# Altium integrated library Integrated_Library - 02.02.25 - 22.49.IntLib: 792 symbols (part 3 of 11)
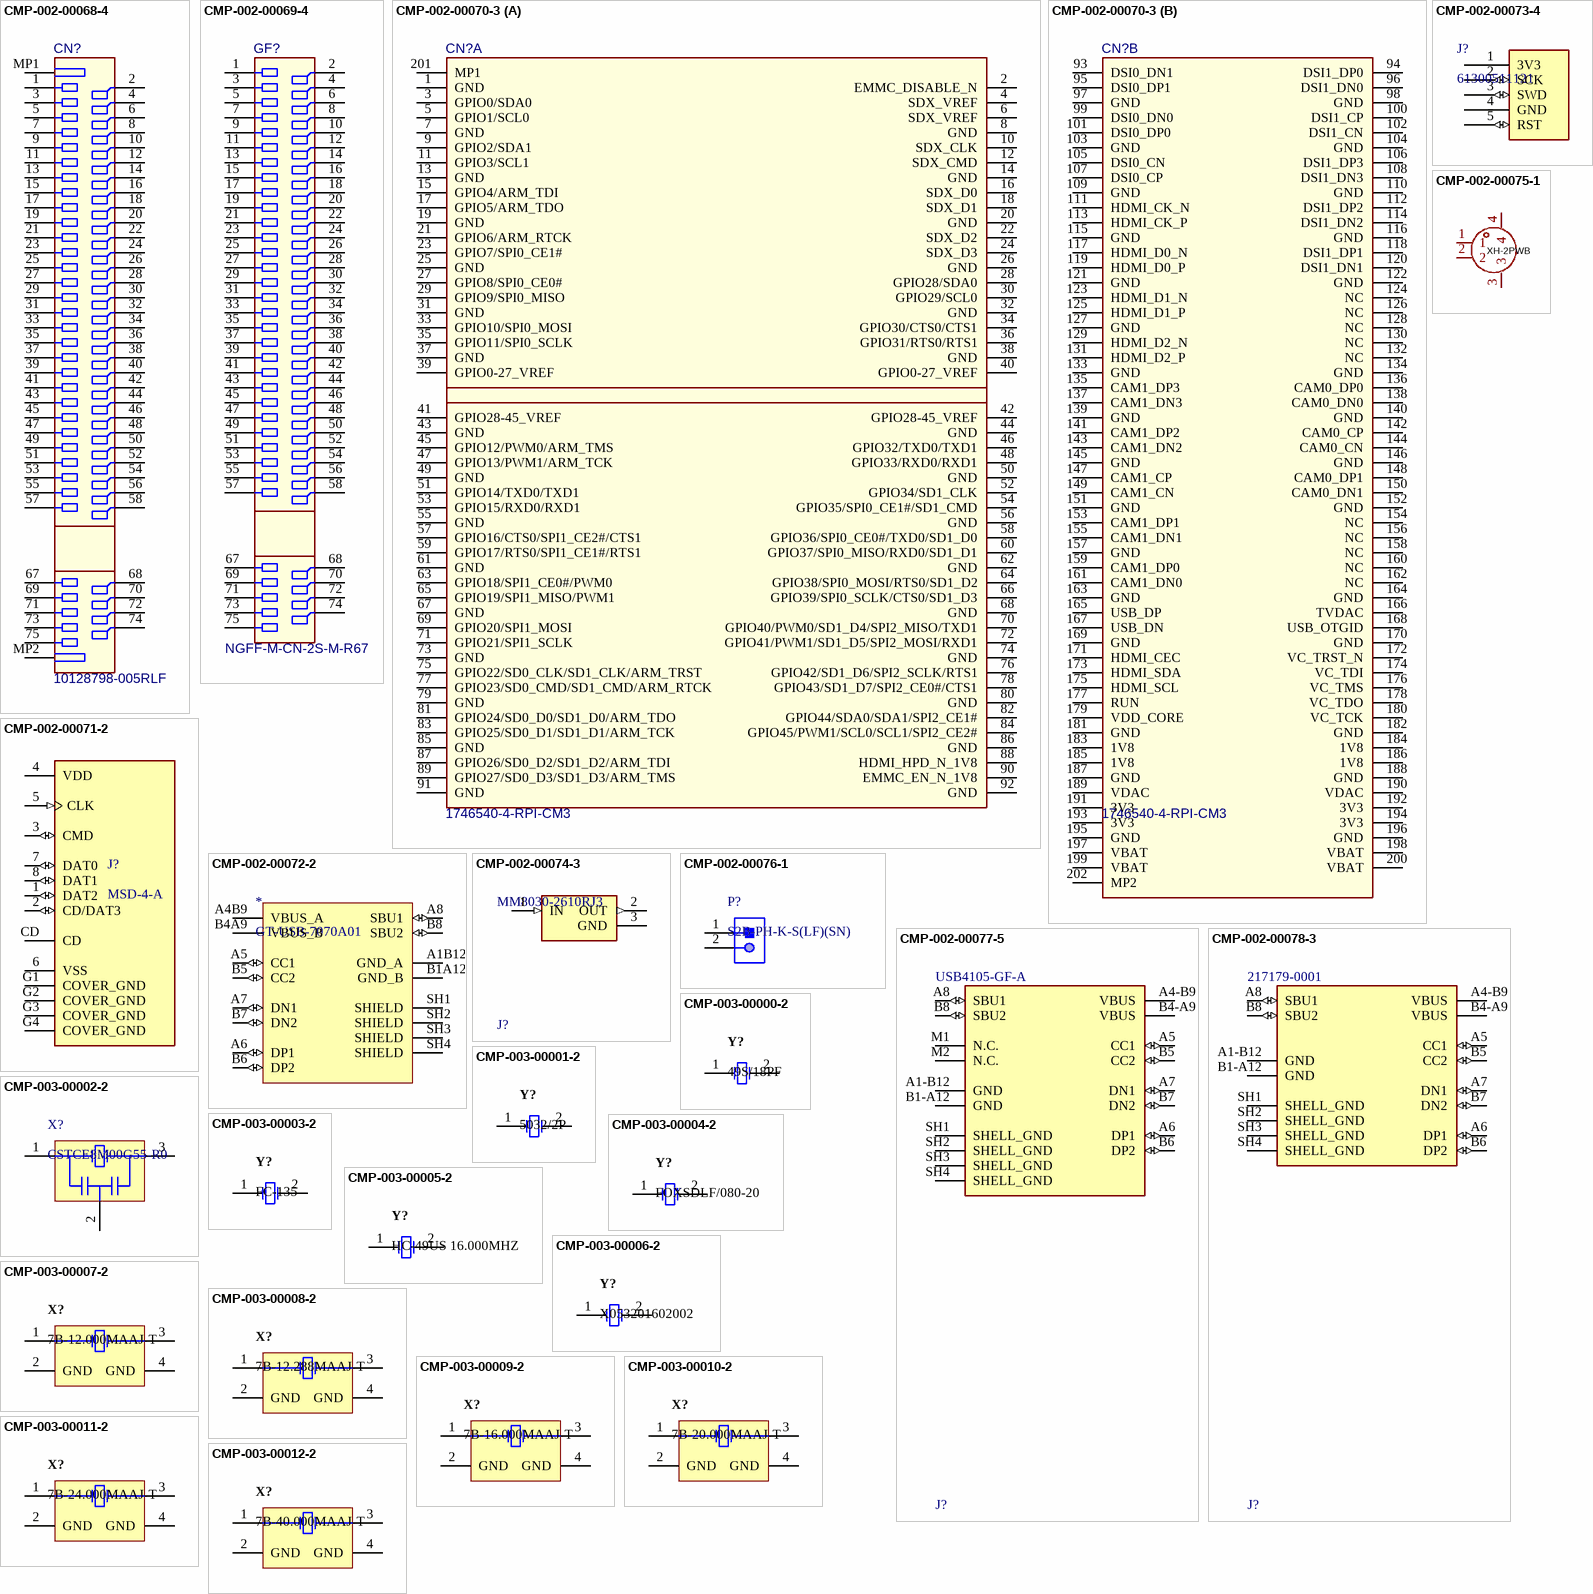
[diagram p28: symbols CMP-002-00068-4 to CMP-003-00012-2]

## CMP-002-00070-3
designator CN?, comment 1746540-4-RPI-CM3
Raspberry Pi Compute Module 3 socket; Pins: 202
footprint TECO-1746540-4_V (SMD, 200-Leads, Body 71.5x26.55mm, Pitch 0.6mm)
footprint TECO-1746540-4_V (SMD, 200-Leads, Body 71.5x26.55mm, Pitch 0.6mm)
part A pins: 1 GND, 2 EMMC_DISABLE_N, 3 GPIO0/SDA0, 4 SDX_VREF, 5 GPIO1/SCL0, 6 SDX_VREF, 7 GND, 8 GND, 9 GPIO2/SDA1, 10 SDX_CLK, 11 GPIO3/SCL1, 12 SDX_CMD, 13 GND, 14 GND, 15 GPIO4/ARM_TDI, 16 SDX_D0, 17 GPIO5/ARM_TDO, 18 SDX_D1, 19 GND, 20 GND, 21 GPIO6/ARM_RTCK, 22 SDX_D2, 23 GPIO7/SPI0_CE1#, 24 SDX_D3, 25 GND, 26 GND, 27 GPIO8/SPI0_CE0#, 28 GPIO28/SDA0, 29 GPIO9/SPI0_MISO, 30 GPIO29/SCL0, 31 GND, 32 GND, 33 GPIO10/SPI0_MOSI, 34 GPIO30/CTS0/CTS1, 35 GPIO11/SPI0_SCLK, 36 GPIO31/RTS0/RTS1, 37 GND, 38 GND, 39 GPIO0-27_VREF, 40 GPIO0-27_VREF, 41 GPIO28-45_VREF, 42 GPIO28-45_VREF, 43 GND, 44 GND, 45 GPIO12/PWM0/ARM_TMS, 46 GPIO32/TXD0/TXD1, 47 GPIO13/PWM1/ARM_TCK, 48 GPIO33/RXD0/RXD1, 49 GND, 50 GND, 51 GPIO14/TXD0/TXD1, 52 GPIO34/SD1_CLK, 53 GPIO15/RXD0/RXD1, 54 GPIO35/SPI0_CE1#/SD1_CMD, 55 GND, 56 GND, 57 GPIO16/CTS0/SPI1_CE2#/CTS1, 58 GPIO36/SPI0_CE0#/TXD0/SD1_D0, 59 GPIO17/RTS0/SPI1_CE1#/RTS1, 60 GPIO37/SPI0_MISO/RXD0/SD1_D1, 61 GND, 62 GND, 63 GPIO18/SPI1_CE0#/PWM0, 64 GPIO38/SPI0_MOSI/RTS0/SD1_D2, 65 GPIO19/SPI1_MISO/PWM1, 66 GPIO39/SPI0_SCLK/CTS0/SD1_D3, 67 GND, 68 GND, 69 GPIO20/SPI1_MOSI, 70 GPIO40/PWM0/SD1_D4/SPI2_MISO/TXD1, 71 GPIO21/SPI1_SCLK, 72 GPIO41/PWM1/SD1_D5/SPI2_MOSI/RXD1, 73 GND, 74 GND, 75 GPIO22/SD0_CLK/SD1_CLK/ARM_TRST, 76 GPIO42/SD1_D6/SPI2_SCLK/RTS1, 77 GPIO23/SD0_CMD/SD1_CMD/ARM_RTCK, 78 GPIO43/SD1_D7/SPI2_CE0#/CTS1, 79 GND, 80 GND, 81 GPIO24/SD0_D0/SD1_D0/ARM_TDO, 82 GPIO44/SDA0/SDA1/SPI2_CE1#, 83 GPIO25/SD0_D1/SD1_D1/ARM_TCK, 84 GPIO45/PWM1/SCL0/SCL1/SPI2_CE2#, 85 GND, 86 GND, 87 GPIO26/SD0_D2/SD1_D2/ARM_TDI, 88 HDMI_HPD_N_1V8, 89 GPIO27/SD0_D3/SD1_D3/ARM_TMS, 90 EMMC_EN_N_1V8, 91 GND, 92 GND, 201 MP1
part B pins: 93 DSI0_DN1, 94 DSI1_DP0, 95 DSI0_DP1, 96 DSI1_DN0, 97 GND, 98 GND, 99 DSI0_DN0, 100 DSI1_CP, 101 DSI0_DP0, 102 DSI1_CN, 103 GND, 104 GND, 105 DSI0_CN, 106 DSI1_DP3, 107 DSI0_CP, 108 DSI1_DN3, 109 GND, 110 GND, 111 HDMI_CK_N, 112 DSI1_DP2, 113 HDMI_CK_P, 114 DSI1_DN2, 115 GND, 116 GND, 117 HDMI_D0_N, 118 DSI1_DP1, 119 HDMI_D0_P, 120 DSI1_DN1, 121 GND, 122 GND, 123 HDMI_D1_N, 124 NC, 125 HDMI_D1_P, 126 NC, 127 GND, 128 NC, 129 HDMI_D2_N, 130 NC, 131 HDMI_D2_P, 132 NC, 133 GND, 134 GND, 135 CAM1_DP3, 136 CAM0_DP0, 137 CAM1_DN3, 138 CAM0_DN0, 139 GND, 140 GND, 141 CAM1_DP2, 142 CAM0_CP, 143 CAM1_DN2, 144 CAM0_CN, 145 GND, 146 GND, 147 CAM1_CP, 148 CAM0_DP1, 149 CAM1_CN, 150 CAM0_DN1, 151 GND, 152 GND, 153 CAM1_DP1, 154 NC, 155 CAM1_DN1, 156 NC, 157 GND, 158 NC, 159 CAM1_DP0, 160 NC, 161 CAM1_DN0, 162 NC, 163 GND, 164 GND, 165 USB_DP, 166 TVDAC, 167 USB_DN, 168 USB_OTGID, 169 GND, 170 GND, 171 HDMI_CEC, 172 VC_TRST_N, 173 HDMI_SDA, 174 VC_TDI, 175 HDMI_SCL, 176 VC_TMS, 177 RUN, 178 VC_TDO, 179 VDD_CORE, 180 VC_TCK, 181 GND, 182 GND, 183 1V8 (power), 184 1V8, 185 1V8, 186 1V8, 187 GND, 188 GND, 189 VDAC, 190 VDAC, 191 3V3, 192 3V3, 193 3V3, 194 3V3, 195 GND, 196 GND, 197 VBAT, 198 VBAT, 199 VBAT, 200 VBAT, 202 MP2

## CMP-002-00071-2
designator J?, comment MSD-4-A
Micro SD Card Connector, 9 Positions, Connector and Ejector, Push In, Auto Eject Out, Surface Mount, 1.8 mm Height Above Board, Gold Flash; MF: CUI Devices; Check_prices: https://www.snapeda.com/parts/MSD-4-A/CUI+Devices/view-part/?ref=eda; SnapEDA_Link: https://www.snapeda.com/parts/MSD-4-A/CUI+Devices/view-part/?ref=snap; CUI_purchase_URL: https://www.cuidevices.com/product/interconnect/connectors/memory-card-connectors/sd-card-connectors/msd-4-a?utm_source=snapeda.com&utm_medium=referral&utm_campaign=snapedaBOM; MP: MSD-4-A; Case/Package: None; Source: MSD-4-A.SchLib; Value: *; Component Type: Standard; Pins: 13; Design Item ID: MSD-4-A
footprint CUI_MSD-4-A
footprint CUI_MSD-4-A
pins: 1 DAT2 (io), 2 CD/DAT3 (io), 3 CMD (io), 4 VDD (power), 5 CLK (in), 6 VSS (power), 7 DAT0 (io), 8 DAT1 (io), CD, G1 COVER_GND (power), G2 COVER_GND (power), G3 COVER_GND (power), G4 COVER_GND (power)

## CMP-002-00072-2
designator *, comment GT-USB-7070A01
USB 2.0 5A 1 260℃ Horizontal attachment 16P Female -40℃~+85℃ Gold High conductivity copper Type-C SMD USB Connectors...; Connector Type: USB 2.0 Type C; Voltage Rating: 24V; Min Operating Temperature: -40°C; Max Operating Temperature: 85°C; RoHS Compliant: Yes; Gender: Female; Mounting Technology: SMD; Pins: 16; Case/Package: SMD; Max Current Rating: 5A
footprint GT-USB-7070A01-Footprint-1
pins: A1B12 GND_A (power), A4B9 VBUS_A (power), A5 CC1 (io), A6 DP1 (io), A7 DN1 (io), A8 SBU1 (io), B1A12 GND_B (power), B4A9 VBUS_B (power), B5 CC2 (io), B6 DP2 (io), B7 DN2 (io), B8 SBU2 (io), SH1 SHIELD, SH2 SHIELD, SH3 SHIELD, SH4 SHIELD

## CMP-002-00073-4
designator J?, comment 61300511121
Board Connector, 5 Contact(s), 1 Row(s), Male, Straight, 0.1 inch Pitch, Solder Terminal, Locking, Black Insulator, Plug; Body Length: 0.5inch; Body/Shell Style: PLUG; Body Breadth: 0.1inch; Min Operating Temperature: -40°C; RoHS Compliant: Yes; Max Operating Temperature: 125°C; Mounting Technology: Board; Body Depth: 0.1inch; Connector Type: BOARD CONNECTOR
footprint New footprint 1-33
footprint 61300511121 (Pin Header, pitch 2.54 mm, THT, Vertical, single row, 5p)
pins: 1 3V3 (power), 2 SCK (io), 3 SWD (io), 4 GND (power), 5 RST (io)

## CMP-002-00074-3
designator J?, comment MM8030-2610RJ3
RF Connector, Female, Board Mount, Surface Mount Terminal; Insertion Loss: 0.5dB; VSWR: 1.5; IEC Conformance: No; Panel Mount: No; Option: General Purpose; Characteristic Impedance: 50R; Operating Frequency-Max: 11GHz; Coupling Type: Snap; Reach SVHC Compliant: No; Mounting Technology: Board; Termination: SMD/SMT; Connector Type: RF CONNECTOR; MIL Conformance: No; Contact Gender: Female; Filter Feature: No; Mounting Style: STRAIGHT; DIN Conformance: No
footprint FP-MM8030-2610RJ3-MFG
pins: 1 IN (in), 2 OUT (out), 3 GND (power)

## CMP-002-00075-1
designator FPC?, comment XH-2PWB
JST Connector XH-2PWB; Manufacturer: DEALON(德艺隆); Symbol: XH-2PWB_C2905024; Add into BOM: yes; Pins Structure: 1x2P; Pitch: 2.5mm; Reference Series: XH; Number of PINs Per Row: 2; Current Rating (Max): 3A; Device: XH-2PWB; LCSC Part Name: 1x2P 间距:2.5mm 卧贴 系列:XH; Supplier Part: C2905024; Manufacturer Part: XH-2PWB; Supplier Footprint: SMD,P=2.5mm,卧贴; JLCPCB Part Class: Extended Part; Datasheet: https://atta.szlcsc.com/upload/public/pdf/source/20211025/6C2B75DB1AEBD099C7E95723735B67A6.pdf; Supplier: LCSC; Convert to PCB: yes; Mounting Style: 卧贴; Number of Pins: 2P; Number of Rows: 1; Row Spacing: -; Operating Temperature Range: -25℃~+85℃
footprint CONN-SMD_2P-P2.50_DEALON_XH-2PWB_C2905024
footprint New footprint 1-33
pins: 1, 2, 3, 4

## CMP-002-00076-1
designator P?, comment S2B-PH-K-S(LF)(SN)
Header for PCB; pitch 2.00mm; 2-contacts; THT; male; side entry; 100V/2A
footprint JST-S2B-PH-K-S_V-22 (THD, 2-Leads, Body 7.6x5.9mm, Pitch 2mm)
pins: 1, 2

## CMP-002-00077-5
designator J?, comment USB4105-GF-A
Conn USB 2.0 Type C RCP 24 POS 0.3mm/0.5mm Solder RA SMD 24 Terminal 1 Port T/R
footprint FP-USB4105-GF-A-MFG
pins: A1-B12 GND (power), A4-B9 VBUS (power), A5 CC1 (io), A6 DP1 (io), A7 DN1 (io), A8 SBU1 (io), B1-A12 GND (power), B4-A9 VBUS (power), B5 CC2 (io), B6 DP2 (io), B7 DN2 (io), B8 SBU2 (io), M1 N.C., M2 N.C., SH1 SHELL_GND (power), SH2 SHELL_GND (power), SH3 SHELL_GND (power), SH4 SHELL_GND (power)

## CMP-002-00078-3
designator J?, comment 217179-0001
USB Connector, 16 Contact(s), Female, Right Angle, Surface Mount Terminal, Locking, Receptacle
footprint FP-2171790001-MFG
pins: A1-B12 GND (power), A4-B9 VBUS (power), A5 CC1 (io), A6 DP1 (io), A7 DN1 (io), A8 SBU1 (io), B1-A12 GND (power), B4-A9 VBUS (power), B5 CC2 (io), B6 DP2 (io), B7 DN2 (io), B8 SBU2 (io), SH1 SHELL_GND (power), SH2 SHELL_GND (power), SH3 SHELL_GND (power), SH4 SHELL_GND (power)

## CMP-003-00000-2
designator Y?, comment 49S/18PF
Crystal, 16 MHz, +/-20 ppm, 18 pF, -20 to 70 degC, 2-Pin THD, RoHS; Manufacturer: Shenzhen Jingpengyuan; Frequency: 16MHz; Package Description: 2-Pin Through Hole Device, Body 11.05 x 4.65 mm, Pitch 4.88 mm; Mounting Technology: TH; Datasheet Version: Aug-14; Package Reference: 49S-18PF; RoHS Compliant: Unknown; Datasheet URL: http://datasheet.octopart.com/49S-18PF-Xinhunjing-datasheet-30677139.pdf; Case/Package: 49S-18PF; Manufacturer URL: http://www.chjiahui.com/
footprint JPY-49S-18PF (THD, 2-Leads, Body 11.05x4.65mm, Pitch 4.88mm)
pins: 1, 2

## CMP-003-00001-2
designator Y?, comment 5032/2P
SMD Quartz Crystal, 10 to 50 MHz, +/-30 ppm, 8 to 32 pF, 2-Pin SMD, RoHS, Tape and Reel; Manufacturer: NEWXTAL; RoHS Compliant: Unknown; Package Description: 2-Pin Surface Mount Device, Body 5 x 3.2 mm; Mounting Technology: SM; Manufacturer URL: http://www.newxtal.com/; Datasheet Version: Aug-09; Case/Package: 5032-2P; Package Reference: 5032-2P; Datasheet URL: http://www.newxtal.com/FILES/data/200984214656762.pdf
footprint NEWX-5032-2P_V (SMD, 2-Leads, Body 5x3.2mm)
pins: 1, 2

## CMP-003-00002-2
designator X?, comment CSTCE8M00G55-R0
Ceramic Resonator, 8 MHz, +/- 0.5%, 30/33/39 pF, -20 to 80 degC, 3-Pin SMD, RoHS, Tape and Reel; Manufacturer: Murata; Impedance: 40Ohm; Frequency: 8MHz; Load Capacitance: 33pF; Packaging: TapeandReel; Datasheet URL: http://www.murata.com/~/media/webrenewal/support/library/catalog/products/timingdevice/ceralock/p16e.ashx; Package Reference: CSTCE_G_A-3; Min Operating Temperature: -20°C; Manufacturer URL: http://www.murata.com/; Pins: 3; Tolerance: 0.5%; Self Resonant Frequency: 8MHz; Package Description: 3-Pin Surface Mount Device, Body 3.2 x 1.3 mm, Pitch 1.2 mm; Mounting Technology: SM; RoHS Compliant: True; Datasheet Version: Dec-15; Package Quantity: 1; Case/Package: CSMD; Max Operating Temperature: 80°C; Frequency Tolerance: 0.5%
footprint MURA-CSTCE_G_A-3_V (SMD, 3-Leads, Body 3.2x1.3mm, Pitch 1.2mm)
pins: 1 X1, 2 GND (power), 3 X2

## CMP-003-00003-2
designator Y?, comment FC-135
Crystal Unit, 32 to 77.5 KHz, 0.5 to 1.3 pF, -40 to 85 degC, 2-Pin SMD, RoHS; Manufacturer: Epson; Manufacturer URL: https://www.eea.epson.com/; Datasheet URL: http://www5.epsondevice.com/en/products/khz_range/fc135r.html#; Mounting Technology: SM; Package Description: 2-Pin Surface Mount Device, Body 3.2 x 1.5 mm; Datasheet Version: Feb-15; Package Reference: FC-135; RoHS Compliant: False; Case/Package: FC-135
footprint EPSON-FC-135_V (SMD, 2-Leads, Body 3.2x1.5mm)
pins: 1, 2

## CMP-003-00004-2
designator Y?, comment FOXSDLF/080-20
Resistance Weld Crystal, 8 MHz, +/- 30 ppm, 20 pF, -20 to 70 degC, 2-Pin SMD, RoHS, Tape and Reel; Manufacturer: FOX Electronics; Resistance: 80Ohm; Load Capacitance: 20pF; ESR: 80; Frequency: 8MHz; Frequency Tolerance: 30ppm; Tolerance: 50ppm; Max Operating Temperature: 70°C; Pins: 2; Case/Package: HC49SDLF; Min Operating Temperature: -20°C; Mounting Technology: SM; Packaging: CutTape; Package Description: 2-Pin Surface Mount Device, Body 5 x 11.7 mm; RoHS Compliant: True; Package Reference: HC49SDLF; Package Quantity: 1; Manufacturer URL: http://www.foxonline.com/; Datasheet Version: Mar-15; Datasheet URL: http://www.foxonline.com/pdfs/hc49sdlf.pdf
footprint FOX-HC49SDLF_V (SMD, 2-Leads, Body 5x11.7mm)
pins: 1, 2

## CMP-003-00005-2
designator Y?, comment HC-49US 16.000MHZ
Crystal, 16 MHz, +/- 30 ppm, 18 pF, -20 to 70 degC, 2-Pin THD; Manufacturer: Jing peng yuan; Frequency: 16MHz; Package Reference: HC-49US; Case/Package: HC-49US; RoHS Compliant: Unknown; Mounting Technology: TH; Package Description: 2-Pin Throug Hole Device, Body 11.05 x 4.65 mm, Pitch 4.9 mm; Datasheet URL: https://statics3.seeedstudio.com/images/opl/datasheet/306010014.pdf; Datasheet Version: May-15
footprint JPY-HC-49US (THD, 2-Leads, Body 11.05x4.65mm, Pitch 4.9mm)
pins: 1, 2

## CMP-003-00006-2
designator Y?, comment X053201602002
SMD Crystal, 16 MHz, +/- 20 ppm, 8 pF, -20 to 70 degC, 2-Pin SMD; Manufacturer: Shenzhen Jingpengyuan; Frequency: 16MHz; Datasheet URL: http://datasheet.octopart.com/X053201602002-Jingpengyuan-datasheet-62330935.pdf; RoHS Compliant: Unknown; Case/Package: X053201602002; Manufacturer URL: http://www.chjiahui.com/; Datasheet Version: May-13; Package Reference: X053201602002; Package Description: 2-Pin Surface Mount Device, Body 5 x 3.2 mm; Mounting Technology: SM
footprint JPY-X053201602002_V (SMD, 2-Leads, Body 5x3.2mm)
pins: 1, 2

## CMP-003-00007-2
designator X?, comment 7B-12.000MAAJ-T
SMD Seam Sealing Crystal, 12 MHz, +/- 30 ppm, 18 pF, -10 to 70 degC, 4-Pin SMD, RoHS, Tape and Reel; Manufacturer: TXC; Frequency: 12MHz; Tolerance: 30ppm; Resistance: 100Ohm; ESR: 40; Load Capacitance: 18pF; Package Quantity: 1; Pins: 4; Datasheet URL: http://www.txccorp.com/download/products/quartz_crystals/2015TXC_7B_19.pdf; Case/Package: 7B-4; Max Operating Temperature: 70°C; Packaging: TapeandReel; Package Description: 4-Pin Surface Mount Device, Body 5 x 3.2 mm, Pitch 3.7 mm; Frequency Tolerance: 30ppm; RoHS Compliant: True; Mounting Technology: SM; Package Reference: 7B-4; Min Operating Temperature: -20°C; Datasheet Version: Jul-15
footprint TXC-7B-4_V (SMD, 4-Leads, Body 5x3.2mm, Pitch 3.7mm)
pins: 1 X1, 2 GND (power), 3 X2, 4 GND (power)

## CMP-003-00008-2
designator X?, comment 7B-12.288MAAJ-T
SMD Seam Sealing Crystal, 12.288 MHz, +/- 30 ppm, 18 pF, -10 to 70 degC, 4-Pin SMD, RoHS, Tape and Reel; Manufacturer: TXC; Frequency Tolerance: 30ppm; ESR: 40; Load Capacitance: 18pF; Datasheet URL: http://www.txccorp.com/download/products/quartz_crystals/2015TXC_7B_19.pdf; Case/Package: 7B-4; Min Operating Temperature: -20°C; Package Reference: 7B-4; Datasheet Version: Jul-15; Tolerance: 30ppm; Packaging: TapeandReel; Mounting Technology: SM; Max Operating Temperature: 70°C; Package Quantity: 1000; RoHS Compliant: True; Pins: 4; Package Description: 4-Pin Surface Mount Device, Body 5 x 3.2 mm, Pitch 3.7 mm; Frequency: 12.288MHz
footprint TXC-7B-4_V (SMD, 4-Leads, Body 5x3.2mm, Pitch 3.7mm)
pins: 1 X1, 2 GND (power), 3 X2, 4 GND (power)

## CMP-003-00009-2
designator X?, comment 7B-16.000MAAJ-T
SMD Seam Sealing Crystal, 16 MHz, +/- 30 ppm, 18 pF, -10 to 70 degC, 4-Pin SMD, RoHS, Tape and Reel; Manufacturer: TXC; ESR: 40; Resistance: 40Ohm; Frequency: 16MHz; Tolerance: 30ppm; Load Capacitance: 18pF; Datasheet Version: Jul-15; Datasheet URL: http://www.txccorp.com/download/products/quartz_crystals/2015TXC_7B_19.pdf; Min Operating Temperature: -10°C; Case/Package: 7B-4; Package Description: 4-Pin Surface Mount Device, Body 5 x 3.2 mm, Pitch 3.7 mm; RoHS Compliant: True; Mounting Technology: SM; Max Operating Temperature: 70°C; Package Reference: 7B-4; Package Quantity: 1000; Packaging: TapeandReel; Pins: 4; Frequency Tolerance: 30ppm
footprint TXC-7B-4_V (SMD, 4-Leads, Body 5x3.2mm, Pitch 3.7mm)
pins: 1 X1, 2 GND (power), 3 X2, 4 GND (power)

## CMP-003-00010-2
designator X?, comment 7B-20.000MAAJ-T
SMD Seam Sealing Crystal, 20 MHz, +/- 30 ppm, 18 pF, -10 to 70 degC, 4-Pin SMD, RoHS, Tape and Reel; Manufacturer: TXC; Tolerance: 30ppm; Resistance: 40Ohm; Load Capacitance: 18pF; Frequency: 20MHz; ESR: 40; Package Reference: 7B-4; Mounting Technology: SM; RoHS Compliant: True; Package Quantity: 1000; Package Description: 4-Pin Surface Mount Device, Body 5 x 3.2 mm, Pitch 3.7 mm; Case/Package: 7B-4; Pins: 4; Datasheet Version: Jul-15; Datasheet URL: http://www.txccorp.com/download/products/quartz_crystals/2015TXC_7B_19.pdf; Packaging: TapeandReel; Frequency Tolerance: 30ppm; Min Operating Temperature: -20°C; Max Operating Temperature: 70°C
footprint TXC-7B-4_V (SMD, 4-Leads, Body 5x3.2mm, Pitch 3.7mm)
pins: 1 X1, 2 GND (power), 3 X2, 4 GND (power)

## CMP-003-00011-2
designator X?, comment 7B-24.000MAAJ-T
SMD Seam Sealing Crystal, 24 MHz, +/- 30 ppm, 18 pF, -10 to 70 degC, 4-Pin SMD, RoHS, Tape and Reel; Manufacturer: TXC; Resistance: 40Ohm; Frequency: 24MHz; Tolerance: 30ppm; ESR: 40; Load Capacitance: 18pF; Package Description: 4-Pin Surface Mount Device, Body 5 x 3.2 mm, Pitch 3.7 mm; Pins: 4; Mounting Technology: SM; Package Reference: 7B-4; Max Operating Temperature: 70°C; Package Quantity: 1000; Min Operating Temperature: -20°C; Datasheet URL: http://www.txccorp.com/download/products/quartz_crystals/2015TXC_7B_19.pdf; RoHS Compliant: True; Datasheet Version: Jul-15; Case/Package: 7B-4; Packaging: TapeandReel; Frequency Tolerance: 30ppm
footprint TXC-7B-4_V (SMD, 4-Leads, Body 5x3.2mm, Pitch 3.7mm)
pins: 1 X1, 2 GND (power), 3 X2, 4 GND (power)

## CMP-003-00012-2
designator X?, comment 7B-40.000MAAJ-T
9B Series Quartz Crystal, 40 MHz, +/-30 ppm, 18 pF, -40 to 85 degC, 4-Pin SMD, RoHS, Tape and Reel; Manufacturer: TXC; Tolerance: 30ppm; Resistance: 40Ohm; ESR: 40; Frequency: 40MHz; Load Capacitance: 18pF; Package Quantity: 1; RoHS Compliant: True; Case/Package: 7B-4; Datasheet Version: Jan-10; Packaging: TapeandReel; Package Description: 4-Pin Surface Mount Device, Body 5 x 3.2 mm, Pitch 3.7 mm; Frequency Tolerance: 30ppm; Pins: 4; Datasheet URL: http://www.txccrystal.com/images/pdf/7b.pdf; Max Operating Temperature: 70°C; Min Operating Temperature: -20°C; Mounting Technology: SM; Package Reference: 7B-4
footprint TXC-7B-4_V (SMD, 4-Leads, Body 5x3.2mm, Pitch 3.7mm)
pins: 1 X1, 2 GND (power), 3 X2, 4 GND (power)

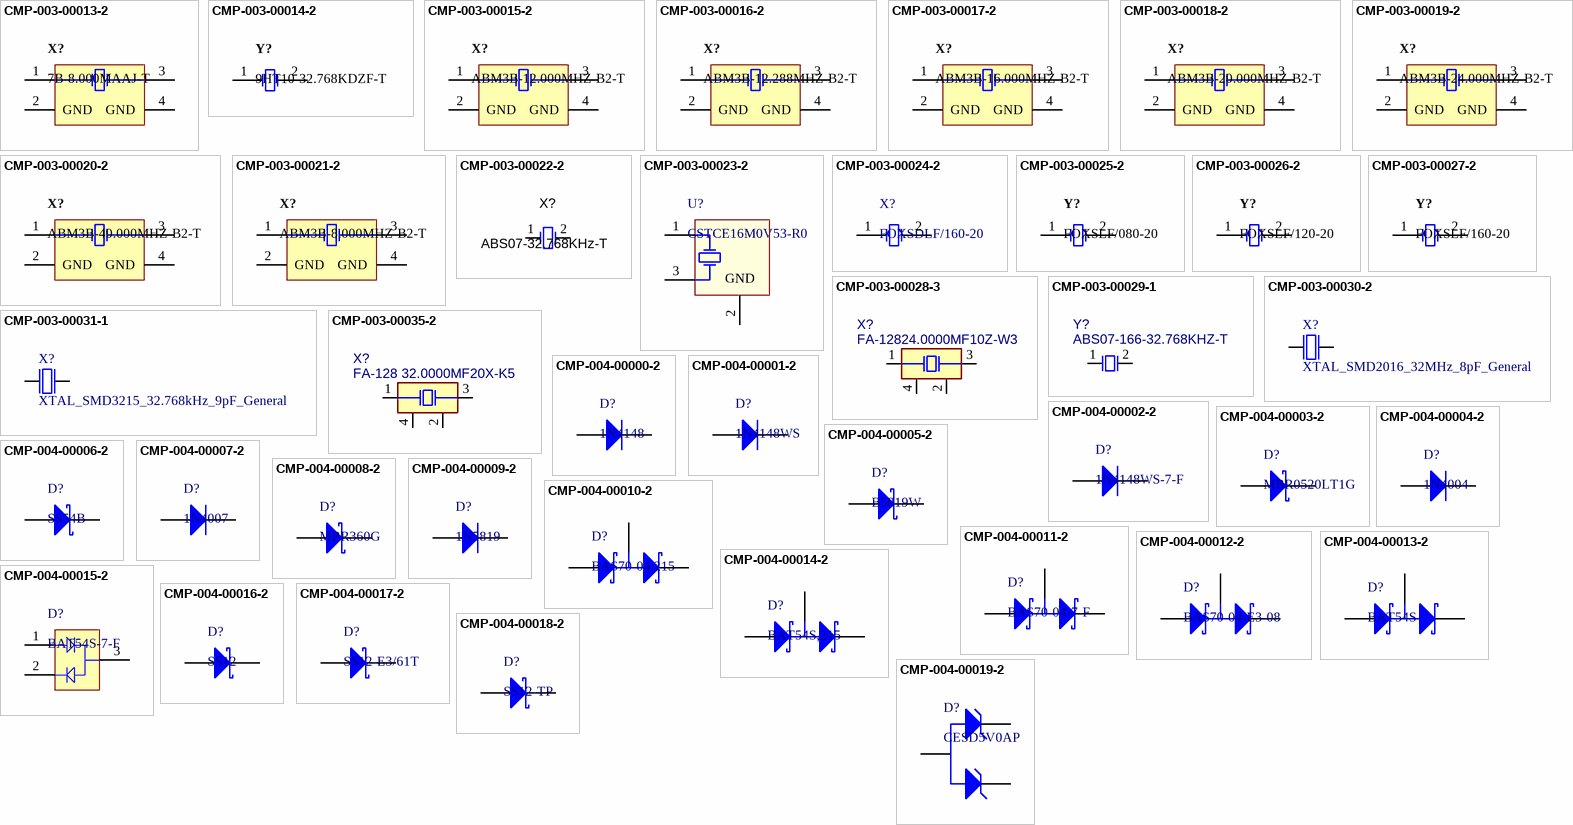
[diagram p6: symbols CMP-003-00013-2 to CMP-004-00019-2]

## CMP-003-00013-2
designator X?, comment 7B-8.000MAAJ-T